# Altium footprint library Binh.PcbLib: 863 footprints (part 32 of 54)
Each footprint in its own frame and in the unit in brackets; x right, y up, seen from the top. Pads: shape width x height; smd on the part's side, far side on the other; paste and mask are expansions set on the pad; w line width, h text height; cw(c..) or ccw(c..) is an arc to the next point about the centre after c.
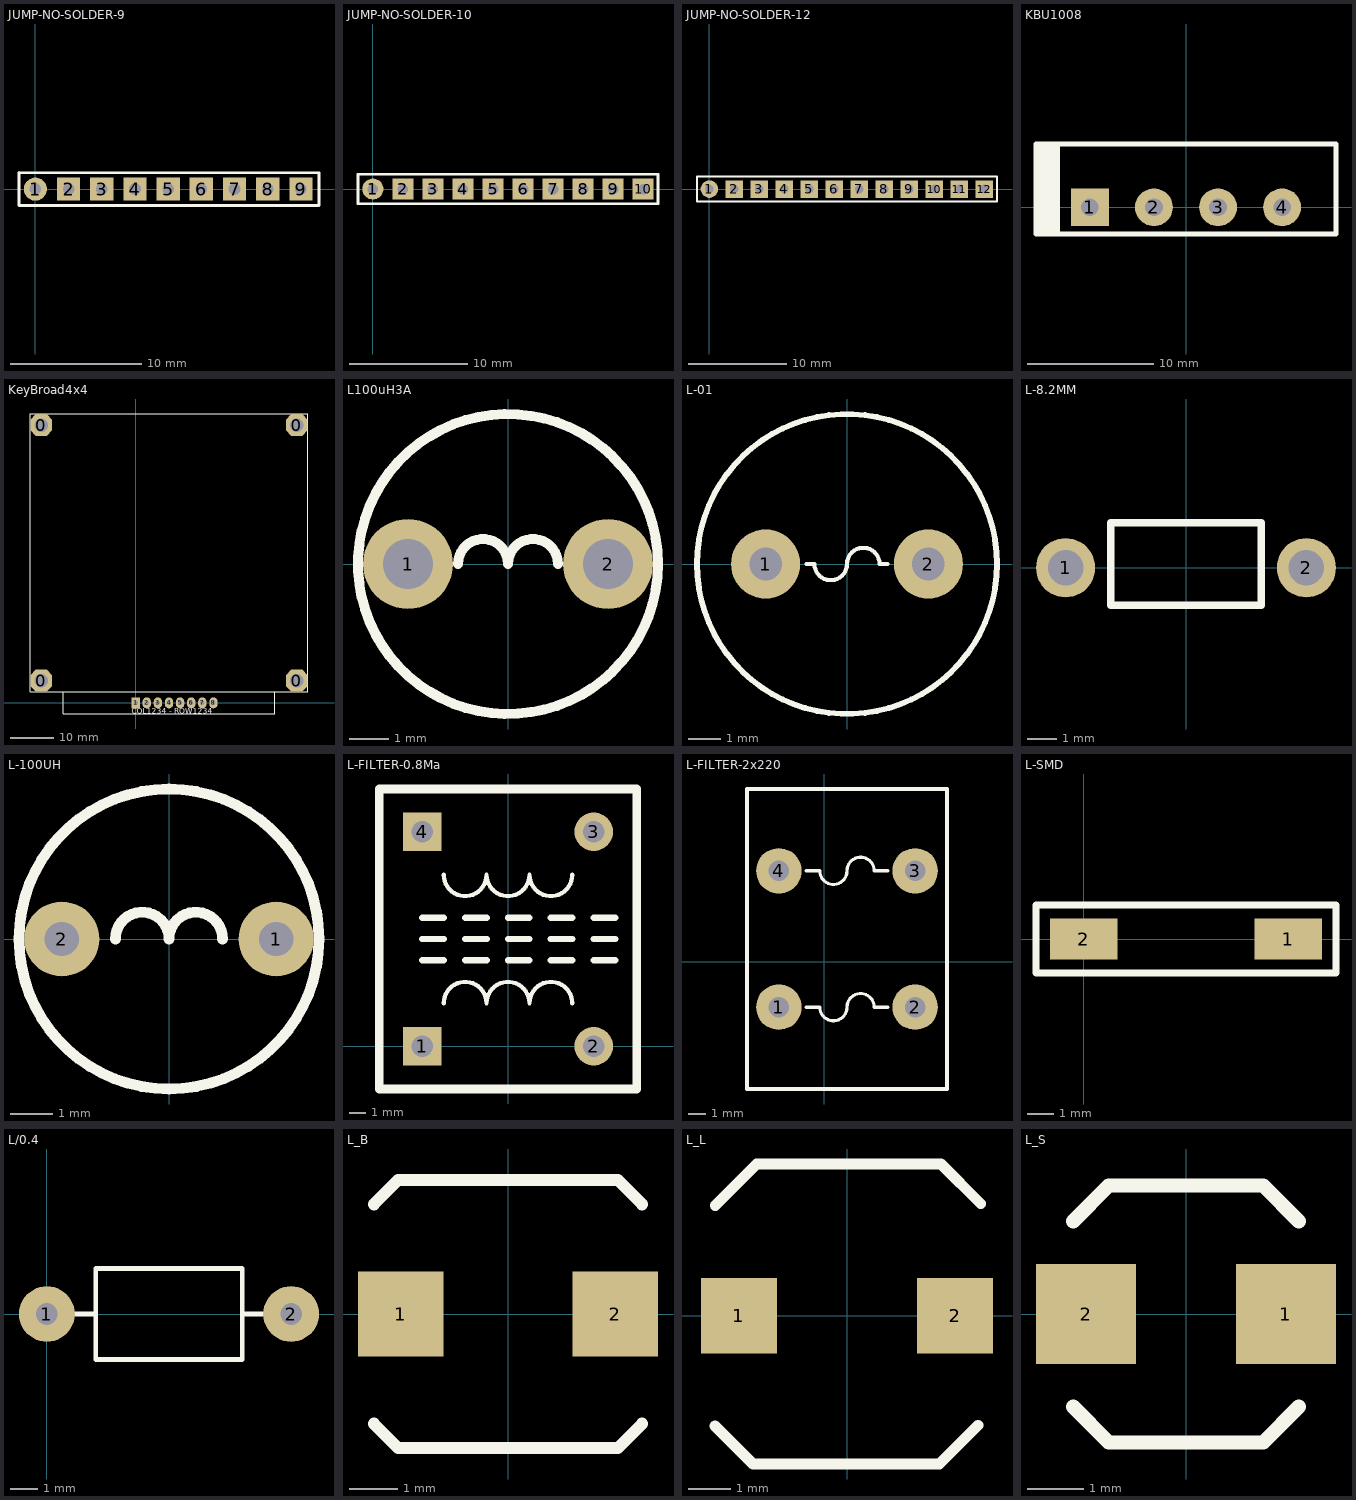
[diagram p31: the footprints below, top view; thin cyan lines are the x and y axes]

## JUMP-NO-SOLDER-9 [mil]
pads (9):
  round 70 hole 35 unplated: 1(0,0)
  rect 70x70 hole 35 unplated: 2(100,0) 3(200,0) 4(300,0) 5(400,0) 6(500,0) 7(600,0) 8(700,0) 9(800,0)
Top Overlay:
  lines w8.66: -49.5,-49.25 800,-49.21 854.5,-49.21 854.5,49.21 800,49.21 -49.5,49.5 -49.5,-49.25

## JUMP-NO-SOLDER-10 [mil]
pads (10):
  round 70 hole 35 unplated: 1(0,0)
  rect 70x70 hole 35 unplated: 2(100,0) 3(200,0) 4(300,0) 5(400,0) 6(500,0) 7(600,0) 8(700,0) 9(800,0) 10(900,0)
Top Overlay:
  lines w8.66: -49.5,-49.25 -49.5,49.5 800,49.21 900,49.21 949.21,49.21 949.21,-49.21 900,-49.21 800,-49.21 -49.5,-49.25

## JUMP-NO-SOLDER-12 [mil]
pads (12):
  round 70 hole 35 unplated: 1(0,0)
  rect 70x70 hole 35 unplated: 2(100,0) 3(200,0) 4(300,0) 5(400,0) 6(500,0) 7(600,0) 8(700,0) 9(800,0) 10(900,0) 11(1000,0) 12(1100,0)
Top Overlay:
  lines w8.66: -49.5,-49.25 1151.5,-49.25 1151.5,50.17 -49.5,49.5 -49.5,-49.25

## KBU1008 [mm] "Diode bridge"
height 7.62
pads (4):
  rect 3x3 hole 1.4: 1(-7.62,0)
  round 3 hole 1.4: 2(-2.54,0) 3(2.54,0) 4(7.62,0)
Top Overlay:
  rectangle: -11.887,-2.108 -10.16,5.004
  lines w0.381: -10.16,-2.108 -10.16,5.004 ; -11.887,-2.108 -11.887,5.004 11.887,5.004 11.887,-2.108 -11.887,-2.108

## KeyBroad4x4 [mm] "KeyBroad 4x4"
height 5.08
pads (12):
  oct 5x5 hole 3.048: 0(-21.59,5.08) 0(-21.59,63.5) 0(36.83,5.08) 0(36.83,63.5)
  rect 1.905x2.5 hole 1: 1(0,0)
  oval 1.905x2.5 hole 1: 2(2.54,0) 3(5.08,0) 4(7.62,0) 5(10.16,0) 6(12.7,0) 7(15.24,0) 8(17.78,0)
Top Overlay:
  lines w0.203: -16.51,2.54 -16.51,-2.515 -16.535,-2.54 31.75,-2.54 31.75,2.489 ; -24.13,2.54 -24.13,66.04 39.37,66.04 39.37,2.54 -24.13,2.54
  text "COL1234 - ROW1234" at -0.889,-2.464 h1.27

## L100uH3A [mil] "100uH3A"
pads (2):
  round 90 hole 50: 1(-100,0) 2(100,0)
Top Overlay:
  circle w10: c0,0 r150
  lines w10: -50,0 cw(c-25,0) 0,0 cw(c25,0) 50,0

## L-01 [mil] "Inductor"
pads (2):
  round 85 hole 40: 1(-100,0) 2(100,0)
Top Overlay:
  circle w7: c0,0 r184.39
  lines w5: -50,0 -40,0 ccw(c-20,0) 0,0 cw(c20,0) 40,0 50,0

## L-8.2MM [mm] "Dang cam giong tro"
pads (2):
  round 2 hole 1.2: 1(-4.064,0) 2(4.064,0)
Top Overlay:
  lines w0.254: -2.54,-1.27 2.54,-1.27 2.54,1.524 -2.54,1.524 -2.54,-1.27

## L-100UH [mil]
pads (2):
  round 70 hole 32: 1(100,0) 2(-100,0)
Top Overlay:
  circle w10: c0,0 r140
  lines w10: -50,0 cw(c-25,0) 0,0 cw(c25,0) 50,0

## L-FILTER-0.8Ma [mil] "Cuon loc nguon 220V 0.8mA"
height 209.84
pads (4):
  rect 90x90 hole 50: 1(-200,0) 4(-200,500)
  round 90 hole 50: 2(200,0) 3(200,500)
Top Overlay:
  lines w10: -150,100 cw(c-100,100) -50,100 cw(c0,100) 50,100 cw(c100,100) 150,100 ; -150,400 ccw(c-100,400) -50,400 ccw(c0,400) 50,400 ccw(c100,400) 150,400
  lines w15: -200,200 -150,200 ; -200,250 -150,250 ; -200,300 -150,300 ; -100,200 -50,200 ; -100,250 -50,250 ; -100,300 -50,300 ; 0,200 50,200 ; 0,250 50,250 ; 0,300 50,300 ; 100,200 150,200 ; 100,250 150,250 ; 100,300 150,300 ; 200,200 250,200 ; 200,250 250,250 ; 200,300 250,300
  lines w20: -300,-100 300,-100 300,600 -300,600 -300,-100

## L-FILTER-2x220 [mil] "Loc 220"
pads (4):
  round 100 hole 45: 1(-100,-100) 2(200,-100) 3(200,200) 4(-100,200)
Top Overlay:
  lines w7: -10,-100 ccw(c20,-100) 50,-100 cw(c80,-100) 110,-100 ; -10,200 ccw(c20,200) 50,200 cw(c80,200) 110,200
  lines w8: -40,-100 -10,-100 ; -40,200 -10,200 ; 110,-100 140,-100 ; 110,200 140,200 ; -170,-280 270,-280 270,380 -170,380 -170,-280

## L-SMD [mil] "cuon cam dan"
pads (2):
  rect 98.43x60 smd: 1(300,0) 2(0,0)
Top Overlay:
  lines w10: -70,-50 370,-50 370,50 -70,50 -70,-50

## L/0.4 [mil] "Inductor , 2 Pin, L 350mil, W 150 mil"
height 150
pads (2):
  round 80 hole 31: 1(0,0) 2(350,0)
Top Overlay:
  lines w7: 70,0 40,0 70,0 ; 70,0 70,-65 280,-65 280,0 ; 70,0 70,65 280,65 280,0 ; 280,0 310,0 280,0

## L_B [mil]
pads (2):
  rect 70x70 smd: 1(-88,0) 2(88,0)
Top Overlay:
  lines w10: -110,-90 -90,-110 90,-110 110,-90 ; -110,90 -90,110 90,110 110,90

## L_L [mil]
pads (2):
  rect 70x70 smd: 1(-100,0) 2(100,0)
Top Overlay:
  lines w10: -122.12,-102.12 -87,-137.25 85.5,-137.25 121.38,-101.38 ; -122,102 -83.5,140.5 87,140.5 123.75,103.75

## L_S [mil]
pads (2):
  rect 70x70 smd: 1(70,0) 2(-70,0)
Top Overlay:
  lines w10: -79,-65 -54,-90 54,-90 79,-65 ; -79,65 -54,90 54,90 79,65